# Altium footprint library Connectors.PcbLib: 70 footprints (part 4 of 5)
Each footprint in its own frame and in the unit in brackets; x right, y up, seen from the top. Pads: shape width x height; smd on the part's side, far side on the other; paste and mask are expansions set on the pad; w line width, h text height; cw(c..) or ccw(c..) is an arc to the next point about the centre after c.
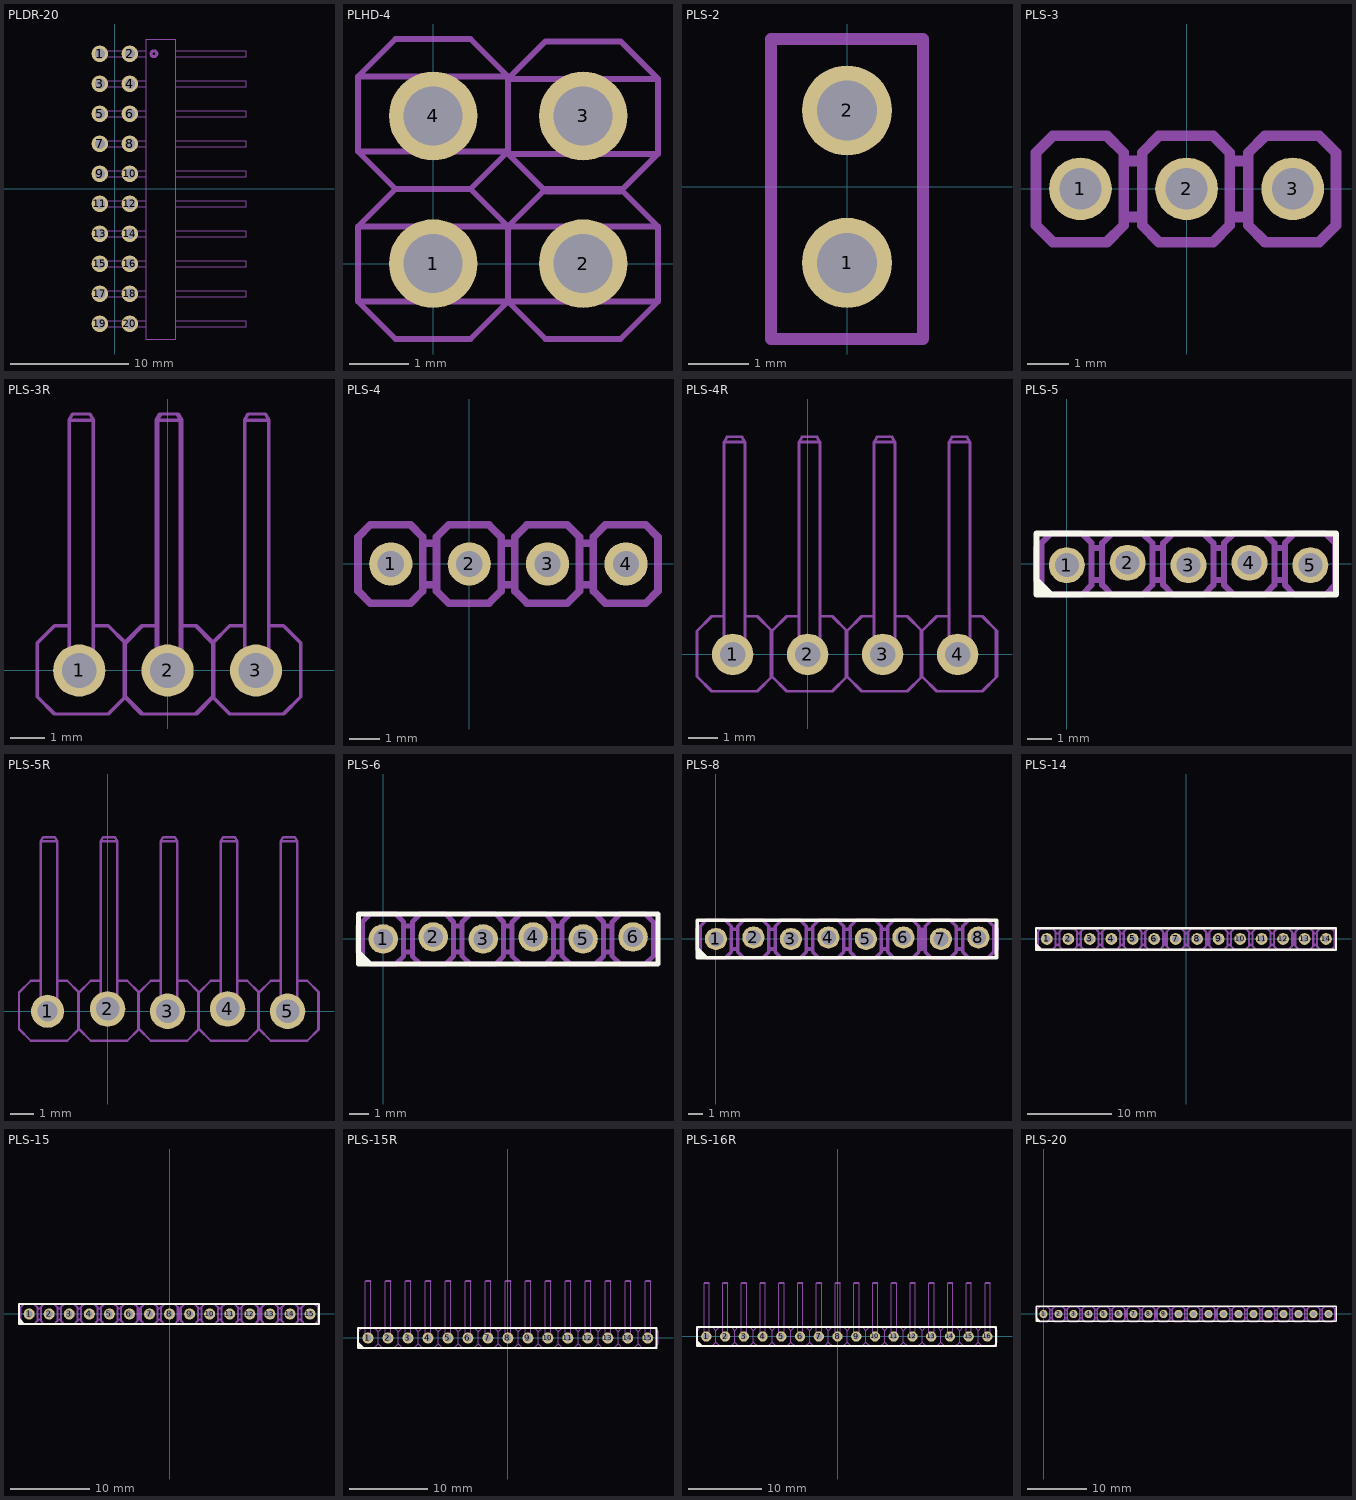
[diagram p3: the footprints below, top view; thin cyan lines are the x and y axes]

## PLDR-20 [mm]
pads (20):
  round 1.4 hole 0.85: 1(-1.27,11.43) 2(1.27,11.43) 3(-1.27,8.89) 4(1.27,8.89) 5(-1.27,6.35) 6(1.27,6.35) 7(-1.27,3.81) 8(1.27,3.81) 9(-1.27,1.27) 10(1.27,1.27) 11(-1.27,-1.27) 12(1.27,-1.27) 13(-1.27,-3.81) 14(1.27,-3.81) 15(-1.27,-6.35) 16(1.27,-6.35) 17(-1.27,-8.89) 18(1.27,-8.89) 19(-1.27,-11.43) 20(1.27,-11.43)
Top Assembly:
  drawing of 151 lines, arcs and shapes, not listed
3D body "User Library-PLDR-6.step": height 5.75, standoff -2.25, extent -1.456,5.057 11.084,12.677
3D body "User Library-PLDR-6.step": height 5.75, standoff -2.25, extent -1.456,2.517 11.084,10.137
3D body "User Library-PLDR-6.step": height 5.75, standoff -2.25, extent -1.456,-5.103 11.084,2.517
3D body "User Library-PLDR-6.step": height 5.75, standoff -2.25, extent -1.456,-12.723 11.084,-5.103

## PLHD-4 [mm]
pads (4):
  round 1.5 hole 1: 1(0,0) 2(2.54,0) 3(2.54,2.5) 4(0,2.5)
Top Assembly:
  lines w0.1: -1.273,-0.642 1.267,-0.642 ; -1.273,-0.642 -0.638,-1.277 0.632,-1.277 1.267,-0.642 ; -1.273,-0.642 -1.273,0.628 ; -1.273,0.628 1.267,0.628 ; -1.273,0.628 -0.638,1.263 ; -1.273,1.898 1.267,1.898 ; -1.273,1.898 -0.638,1.263 ; -1.273,1.898 -1.273,3.168 ; -1.273,3.168 1.267,3.168 ; -1.273,3.168 -0.638,3.803 0.632,3.803 1.267,3.168 ; -0.638,1.263 0.632,1.263 ; -0.638,1.263 0.632,1.263 ; -0.273,-0.277 -0.223,-0.227 ; -0.273,-0.277 -0.323,-0.227 -0.323,0.213 -0.273,0.263 ; -0.273,-0.277 -0.223,-0.327 0.217,-0.327 0.267,-0.277 ; -0.273,0.263 -0.223,0.213 ; -0.273,0.263 -0.223,0.313 0.217,0.313 0.267,0.263 ; -0.273,2.263 -0.223,2.313 ; -0.273,2.263 -0.323,2.313 -0.323,2.753 -0.273,2.803 ; -0.273,2.263 -0.223,2.213 0.217,2.213 0.267,2.263 ; -0.273,2.803 -0.223,2.753 ; -0.273,2.803 -0.223,2.853 0.217,2.853 0.267,2.803 ; -0.223,-0.227 -0.223,0.213 ; -0.223,-0.227 0.217,-0.227 ; -0.223,0.213 0.217,0.213 ; -0.223,2.313 -0.223,2.753 ; -0.223,2.313 0.217,2.313 ; -0.223,2.753 0.217,2.753 ; 0.217,-0.227 0.217,0.213 ; 0.217,-0.227 0.267,-0.277 ; 0.217,0.213 0.267,0.263 ; 0.217,2.313 0.217,2.753 ; 0.217,2.313 0.267,2.263 ; 0.217,2.753 0.267,2.803 ; 0.267,-0.277 0.317,-0.227 0.317,0.213 0.267,0.263 ; 0.267,2.263 0.317,2.313 0.317,2.753 0.267,2.803 ; 0.632,1.263 1.267,1.898 ; 0.632,1.263 1.267,0.628 ; 1.267,-0.642 3.807,-0.642 ; 1.267,-0.642 1.902,-1.277 3.172,-1.277 3.807,-0.642 ; 1.267,-0.642 1.267,0.628 ; 1.267,-0.642 1.267,0.628 ; 1.267,0.628 3.807,0.628 ; 1.267,0.628 1.902,1.263 3.172,1.263 3.807,0.628 ; 1.267,1.858 3.807,1.858 ; 1.267,1.858 1.902,1.223 3.172,1.223 3.807,1.858 ; 1.267,1.858 1.267,3.128 ; 1.267,1.898 1.267,3.168 ; 1.267,3.128 3.807,3.128 ; 1.267,3.128 1.902,3.763 3.172,3.763 3.807,3.128 ; 2.267,-0.277 2.317,-0.227 ; 2.267,-0.277 2.217,-0.227 2.217,0.213 2.267,0.263 ; 2.267,-0.277 2.317,-0.327 2.757,-0.327 2.807,-0.277 ; 2.267,0.263 2.317,0.213 ; 2.267,0.263 2.317,0.313 2.757,0.313 2.807,0.263 ; 2.267,2.223 2.317,2.273 ; 2.267,2.223 2.217,2.273 2.217,2.713 2.267,2.763 ; 2.267,2.223 2.317,2.173 2.757,2.173 2.807,2.223 ; 2.267,2.763 2.317,2.713 ; 2.267,2.763 2.317,2.813 2.757,2.813 2.807,2.763 ; 2.317,-0.227 2.317,0.213 ; 2.317,-0.227 2.757,-0.227 ; 2.317,0.213 2.757,0.213 ; 2.317,2.273 2.317,2.713 ; 2.317,2.273 2.757,2.273 ; 2.317,2.713 2.757,2.713 ; 2.757,-0.227 2.757,0.213 ; 2.757,-0.227 2.807,-0.277 ; 2.757,0.213 2.807,0.263 ; 2.757,2.273 2.757,2.713 ; 2.757,2.273 2.807,2.223 ; 2.757,2.713 2.807,2.763 ; 2.807,-0.277 2.857,-0.227 2.857,0.213 2.807,0.263 ; 2.807,2.223 2.857,2.273 2.857,2.713 2.807,2.763 ; 3.807,-0.642 3.807,0.628 ; 3.807,1.858 3.807,3.128
3D body "User Library-PLH-1.step": height 15.9, standoff -3, extent -1.273,-1.277 1.267,1.263
3D body "User Library-PLH-1.step": height 15.9, standoff -3, extent 1.267,-1.277 3.807,1.263
3D body "User Library-PLH-1.step": height 15.9, standoff -3, extent 1.267,1.223 3.807,3.763
3D body "User Library-PLH-1.step": height 15.9, standoff -3, extent -1.273,1.223 1.267,3.763

## PLS-2 [mm]
pads (2):
  round 1.5 hole 1: 1(0,-1.27) 2(0,1.27)
Top Assembly:
  lines w0.2: -1.27,-2.54 1.27,-2.54 1.27,2.46 -1.27,2.46 -1.27,-2.54
3D body "User Library-PLD-2.step": height 8.5, standoff -3, extent -1.27,-2.54 1.27,2.46

## PLS-3 [mm]
pads (3):
  round 1.5 hole 1: 1(-2.54,0) 2(0,0) 3(2.54,0)
Top Assembly:
  lines w0.254: -1.504,-0.674 -1.064,-0.674 ; -1.504,0.666 -1.064,0.666 ; 1.036,-0.674 1.476,-0.674 ; 1.036,0.666 1.476,0.666 ; -2.874,-0.324 -2.234,-0.324 ; -2.874,-0.324 -2.874,0.316 ; -2.874,-0.324 -2.674,-0.124 ; -2.874,0.316 -2.234,0.316 ; -2.874,0.316 -2.674,0.116 ; -2.674,-0.124 -2.434,-0.124 ; -2.674,-0.124 -2.674,0.116 ; -2.674,0.116 -2.434,0.116 ; -2.434,-0.124 -2.234,-0.324 ; -2.434,-0.124 -2.434,0.116 ; -2.434,0.116 -2.234,0.316 ; -2.234,-0.324 -2.234,0.316 ; -0.334,-0.324 -0.334,0.316 ; -0.334,-0.324 -0.134,-0.124 ; -0.334,-0.324 0.306,-0.324 ; -0.334,0.316 -0.134,0.116 ; -0.334,0.316 0.306,0.316 ; -0.134,-0.124 0.106,-0.124 ; -0.134,-0.124 -0.134,0.116 ; -0.134,0.116 0.106,0.116 ; 0.106,-0.124 0.306,-0.324 ; 0.106,-0.124 0.106,0.116 ; 0.106,0.116 0.306,0.316 ; 0.306,-0.324 0.306,0.316 ; 2.206,-0.324 2.846,-0.324 ; 2.206,-0.324 2.206,0.316 ; 2.206,-0.324 2.406,-0.124 ; 2.206,0.316 2.406,0.116 ; 2.206,0.316 2.846,0.316 ; 2.406,-0.124 2.646,-0.124 ; 2.406,-0.124 2.406,0.116 ; 2.406,0.116 2.646,0.116 ; 2.646,-0.124 2.846,-0.324 ; 2.646,-0.124 2.646,0.116 ; 2.646,0.116 2.846,0.316 ; 2.846,-0.324 2.846,0.316 ; -3.604,-0.874 -3.604,0.866 -3.204,1.266 -1.904,1.266 -1.504,0.866 -1.504,-0.874 -1.904,-1.274 -3.204,-1.274 -3.604,-0.874 ; -1.064,-0.874 -1.064,0.866 -0.664,1.266 0.636,1.266 1.036,0.866 1.036,-0.874 0.636,-1.274 -0.664,-1.274 -1.064,-0.874 ; 1.476,-0.874 1.476,0.866 1.876,1.266 3.176,1.266 3.576,0.866 3.576,-0.874 3.176,-1.274 1.876,-1.274 1.476,-0.874
3D body "User Library-PLD-2.step": height 8.5, standoff -3, extent -1.19,-1.27 3.81,1.27
3D body "User Library-PLD-2.step": height 8.5, standoff -3, extent -3.73,-1.27 1.27,1.27

## PLS-3R [mm]
pads (3):
  round 1.5 hole 1: 1(-2.54,0) 2(0,0) 3(2.54,0)
Top Assembly:
  lines w0.1: -2.83,1.29 -3.25,1.29 -3.75,0.79 -3.75,-0.75 -3.25,-1.25 -1.71,-1.25 -1.21,-0.75 ; -2.13,1.29 -1.71,1.29 -1.21,0.79 ; -0.33,1.29 -0.75,1.29 -1.25,0.79 -1.25,-0.75 -0.75,-1.25 0.79,-1.25 1.29,-0.75 ; -0.29,1.29 -0.71,1.29 -1.21,0.79 ; 0.37,1.29 0.79,1.29 1.29,0.79 ; 0.41,1.29 0.83,1.29 1.33,0.79 ; 2.21,1.29 1.79,1.29 1.29,0.79 ; 2.91,1.29 3.33,1.29 3.83,0.79 ; -2.83,0.37 -2.13,0.37 ; -2.83,0.37 -2.83,-0.33 -2.13,-0.33 -2.13,0.37 ; -2.83,0.37 -2.83,7.197 ; -2.83,7.197 -2.73,7.37 -2.23,7.37 -2.13,7.197 ; -2.83,7.197 -2.13,7.197 ; -2.13,0.37 -2.13,7.197 ; -1.21,-0.75 -0.71,-1.25 0.83,-1.25 1.33,-0.75 ; -1.21,-0.75 -1.21,0.79 ; -0.33,0.37 0.37,0.37 ; -0.33,0.37 -0.33,-0.33 0.37,-0.33 0.37,0.37 ; -0.33,0.37 -0.33,7.197 ; -0.33,7.197 -0.23,7.37 0.27,7.37 0.37,7.197 ; -0.33,7.197 0.37,7.197 ; -0.29,0.37 0.41,0.37 ; -0.29,0.37 -0.29,-0.33 0.41,-0.33 0.41,0.37 ; -0.29,0.37 -0.29,7.197 ; -0.29,7.197 -0.19,7.37 0.31,7.37 0.41,7.197 ; -0.29,7.197 0.41,7.197 ; 0.37,0.37 0.37,7.197 ; 0.41,0.37 0.41,7.197 ; 1.29,-0.75 1.79,-1.25 3.33,-1.25 3.83,-0.75 ; 1.29,-0.75 1.29,0.79 ; 1.33,-0.75 1.33,0.79 ; 1.33,-0.75 1.33,0.79 ; 2.21,0.37 2.91,0.37 ; 2.21,0.37 2.21,-0.33 2.91,-0.33 2.91,0.37 ; 2.21,0.37 2.21,7.197 ; 2.21,7.197 2.31,7.37 2.81,7.37 2.91,7.197 ; 2.21,7.197 2.91,7.197 ; 2.91,0.37 2.91,7.197 ; 3.83,-0.75 3.83,0.79 ; 3.83,-0.75 3.83,0.79
3D body "User Library-PLS-1R_D1.STEP": height 2.5, standoff -3, extent -3.81,-0.32 -1.27,10.04
3D body "User Library-PLS-1R_D1.STEP": height 2.5, standoff -3, extent -1.27,-0.32 1.27,10.04
3D body "User Library-PLS-1R_D1.STEP": height 2.5, standoff -3, extent 1.27,-0.32 3.81,10.04

## PLS-4 [mm]
pads (4):
  round 1.4 hole 0.85: 1(-2.54,0) 2(0,0) 3(2.54,0) 4(5.08,0)
Top Assembly:
  lines w0.254: -1.504,-0.674 -1.064,-0.674 ; -1.504,0.666 -1.064,0.666 ; 1.036,-0.674 1.476,-0.674 ; 1.036,0.666 1.476,0.666 ; 3.576,-0.674 4.016,-0.674 ; 3.576,0.666 4.016,0.666 ; -2.874,-0.324 -2.234,-0.324 ; -2.874,-0.324 -2.874,0.316 ; -2.874,-0.324 -2.674,-0.124 ; -2.874,0.316 -2.234,0.316 ; -2.874,0.316 -2.674,0.116 ; -2.674,-0.124 -2.434,-0.124 ; -2.674,-0.124 -2.674,0.116 ; -2.674,0.116 -2.434,0.116 ; -2.434,-0.124 -2.234,-0.324 ; -2.434,-0.124 -2.434,0.116 ; -2.434,0.116 -2.234,0.316 ; -2.234,-0.324 -2.234,0.316 ; -0.334,-0.324 -0.334,0.316 ; -0.334,-0.324 -0.134,-0.124 ; -0.334,-0.324 0.306,-0.324 ; -0.334,0.316 -0.134,0.116 ; -0.334,0.316 0.306,0.316 ; -0.134,-0.124 0.106,-0.124 ; -0.134,-0.124 -0.134,0.116 ; -0.134,0.116 0.106,0.116 ; 0.106,-0.124 0.306,-0.324 ; 0.106,-0.124 0.106,0.116 ; 0.106,0.116 0.306,0.316 ; 0.306,-0.324 0.306,0.316 ; 2.206,-0.324 2.846,-0.324 ; 2.206,-0.324 2.206,0.316 ; 2.206,-0.324 2.406,-0.124 ; 2.206,0.316 2.406,0.116 ; 2.206,0.316 2.846,0.316 ; 2.406,-0.124 2.646,-0.124 ; 2.406,-0.124 2.406,0.116 ; 2.406,0.116 2.646,0.116 ; 2.646,-0.124 2.846,-0.324 ; 2.646,-0.124 2.646,0.116 ; 2.646,0.116 2.846,0.316 ; 2.846,-0.324 2.846,0.316 ; 3.576,-0.874 3.576,0.866 ; 3.576,-0.874 3.576,0.866 ; 3.576,-0.874 3.176,-1.274 1.876,-1.274 1.476,-0.874 1.476,0.866 1.876,1.266 3.176,1.266 3.576,0.866 ; 4.746,-0.324 4.946,-0.124 ; 4.746,-0.324 4.746,0.316 ; 4.746,-0.324 5.386,-0.324 ; 4.746,0.316 5.386,0.316 ; 4.746,0.316 4.946,0.116 ; 4.946,-0.124 4.946,0.116 ; 4.946,-0.124 5.186,-0.124 ; 4.946,0.116 5.186,0.116 ; 5.186,-0.124 5.186,0.116 ; 5.186,-0.124 5.386,-0.324 ; 5.186,0.116 5.386,0.316 ; 5.386,-0.324 5.386,0.316 ; -3.604,-0.874 -3.604,0.866 -3.204,1.266 -1.904,1.266 -1.504,0.866 -1.504,-0.874 -1.904,-1.274 -3.204,-1.274 -3.604,-0.874 ; -1.064,-0.874 -1.064,0.866 -0.664,1.266 0.636,1.266 1.036,0.866 1.036,-0.874 0.636,-1.274 -0.664,-1.274 -1.064,-0.874 ; 4.016,-0.874 4.416,-1.274 5.716,-1.274 6.116,-0.874 6.116,0.866 5.716,1.266 4.416,1.266 4.016,0.866 4.016,-0.874
3D body "User Library-PLD-2.step": height 8.5, standoff -3, extent 1.35,-1.27 6.35,1.27
3D body "User Library-PLD-2.step": height 8.5, standoff -3, extent -3.73,-1.27 1.27,1.27

## PLS-4R [mm]
pads (4):
  round 1.4 hole 0.85: 1(-2.54,0) 2(0,0) 3(2.54,0) 4(5.08,0)
Top Assembly:
  lines w0.1: -2.83,1.29 -3.25,1.29 -3.75,0.79 -3.75,-0.75 -3.25,-1.25 -1.71,-1.25 -1.21,-0.75 ; -2.13,1.29 -1.71,1.29 -1.21,0.79 ; -1.25,-0.75 -1.25,0.79 ; -0.29,1.29 -0.71,1.29 -1.21,0.79 ; 0.41,1.29 0.83,1.29 1.33,0.79 ; 1.29,-0.75 1.29,0.79 ; 2.25,1.29 1.83,1.29 1.33,0.79 ; 2.95,1.29 3.37,1.29 3.87,0.79 ; 3.83,-0.75 3.83,0.79 ; 4.79,1.29 4.37,1.29 3.87,0.79 ; 5.49,1.29 5.91,1.29 6.41,0.79 6.41,-0.75 5.91,-1.25 4.37,-1.25 3.87,-0.75 ; 6.37,-0.75 6.37,0.79 ; -2.83,0.37 -2.13,0.37 ; -2.83,0.37 -2.83,-0.33 -2.13,-0.33 -2.13,0.37 ; -2.83,0.37 -2.83,7.197 ; -2.83,7.197 -2.73,7.37 -2.23,7.37 -2.13,7.197 ; -2.83,7.197 -2.13,7.197 ; -2.13,0.37 -2.13,7.197 ; -1.21,-0.75 -1.21,0.79 ; -1.21,-0.75 -0.71,-1.25 0.83,-1.25 1.33,-0.75 ; -1.21,-0.75 -1.21,0.79 ; -0.29,0.37 0.41,0.37 ; -0.29,0.37 -0.29,-0.33 0.41,-0.33 0.41,0.37 ; -0.29,0.37 -0.29,7.197 ; -0.29,7.197 -0.19,7.37 0.31,7.37 0.41,7.197 ; -0.29,7.197 0.41,7.197 ; 0.41,0.37 0.41,7.197 ; 1.33,-0.75 1.33,0.79 ; 1.33,-0.75 1.83,-1.25 3.37,-1.25 3.87,-0.75 ; 1.33,-0.75 1.33,0.79 ; 2.25,0.37 2.95,0.37 ; 2.25,0.37 2.25,-0.33 2.95,-0.33 2.95,0.37 ; 2.25,0.37 2.25,7.197 ; 2.25,7.197 2.35,7.37 2.85,7.37 2.95,7.197 ; 2.25,7.197 2.95,7.197 ; 2.95,0.37 2.95,7.197 ; 3.87,-0.75 3.87,0.79 ; 3.87,-0.75 3.87,0.79 ; 4.79,0.37 5.49,0.37 ; 4.79,0.37 4.79,-0.33 5.49,-0.33 5.49,0.37 ; 4.79,0.37 4.79,7.197 ; 4.79,7.197 4.89,7.37 5.39,7.37 5.49,7.197 ; 4.79,7.197 5.49,7.197 ; 5.49,0.37 5.49,7.197
3D body "User Library-PLS-1R_D1.STEP": height 2.5, standoff -3, extent -3.81,-0.32 -1.27,10.04
3D body "User Library-PLS-1R_D1.STEP": height 2.5, standoff -3, extent -1.27,-0.32 1.27,10.04
3D body "User Library-PLS-1R_D1.STEP": height 2.5, standoff -3, extent 1.27,-0.32 3.81,10.04
3D body "User Library-PLS-1R_D1.STEP": height 2.5, standoff -3, extent 3.81,-0.32 6.35,10.04

## PLS-5 [mm]
pads (5):
  round 1.5 hole 1: 1(0,-0.051) 2(2.54,0.051) 3(5.08,-0.051) 4(7.62,0.051) 5(10.16,-0.051)
Top Overlay:
  region: -1.27,-0.5 -0.5,-1.27 -1.27,-1.27
  lines w0.254: -1.27,-1.27 -1.27,1.27 11.23,1.27 11.23,-1.27 -1.27,-1.27
Top Assembly:
  lines w0.254: -1.064,-0.674 -1.284,-0.674 -1.284,0.666 -1.064,0.666 ; 1.036,-0.674 1.476,-0.674 ; 1.036,0.666 1.476,0.666 ; 3.576,-0.674 4.016,-0.674 ; 3.576,0.666 4.016,0.666 ; 6.116,-0.674 6.556,-0.674 ; 6.116,0.666 6.556,0.666 ; 8.656,-0.674 9.096,-0.674 ; 8.656,0.666 9.096,0.666 ; -0.334,-0.324 0.306,-0.324 ; -0.334,-0.324 -0.334,0.316 ; -0.334,-0.324 -0.134,-0.124 ; -0.334,0.316 0.306,0.316 ; -0.334,0.316 -0.134,0.116 ; -0.134,-0.124 0.106,-0.124 ; -0.134,-0.124 -0.134,0.116 ; -0.134,0.116 0.106,0.116 ; 0.106,-0.124 0.306,-0.324 ; 0.106,-0.124 0.106,0.116 ; 0.106,0.116 0.306,0.316 ; 0.306,-0.324 0.306,0.316 ; 2.206,-0.324 2.206,0.316 ; 2.206,-0.324 2.406,-0.124 ; 2.206,-0.324 2.846,-0.324 ; 2.206,0.316 2.406,0.116 ; 2.206,0.316 2.846,0.316 ; 2.406,-0.124 2.646,-0.124 ; 2.406,-0.124 2.406,0.116 ; 2.406,0.116 2.646,0.116 ; 2.646,-0.124 2.846,-0.324 ; 2.646,-0.124 2.646,0.116 ; 2.646,0.116 2.846,0.316 ; 2.846,-0.324 2.846,0.316 ; 4.746,-0.324 5.386,-0.324 ; 4.746,-0.324 4.746,0.316 ; 4.746,-0.324 4.946,-0.124 ; 4.746,0.316 4.946,0.116 ; 4.746,0.316 5.386,0.316 ; 4.946,-0.124 5.186,-0.124 ; 4.946,-0.124 4.946,0.116 ; 4.946,0.116 5.186,0.116 ; 5.186,-0.124 5.386,-0.324 ; 5.186,-0.124 5.186,0.116 ; 5.186,0.116 5.386,0.316 ; 5.386,-0.324 5.386,0.316 ; 7.286,-0.324 7.926,-0.324 ; 7.286,-0.324 7.286,0.316 ; 7.286,-0.324 7.486,-0.124 ; 7.286,0.316 7.926,0.316 ; 7.286,0.316 7.486,0.116 ; 7.486,-0.124 7.726,-0.124 ; 7.486,-0.124 7.486,0.116 ; 7.486,0.116 7.726,0.116 ; 7.726,-0.124 7.926,-0.324 ; 7.726,-0.124 7.726,0.116 ; 7.726,0.116 7.926,0.316 ; 7.926,-0.324 7.926,0.316 ; 9.826,-0.324 10.466,-0.324 ; 9.826,-0.324 9.826,0.316 ; 9.826,-0.324 10.026,-0.124 ; 9.826,0.316 10.466,0.316 ; 9.826,0.316 10.026,0.116 ; 10.026,-0.124 10.266,-0.124 ; 10.026,-0.124 10.026,0.116 ; 10.026,0.116 10.266,0.116 ; 10.266,-0.124 10.266,0.116 ; 10.266,-0.124 10.466,-0.324 ; 10.266,0.116 10.466,0.316 ; 10.466,-0.324 10.466,0.316 ; -1.064,-0.874 -1.064,0.866 -0.664,1.266 0.636,1.266 1.036,0.866 1.036,-0.874 0.636,-1.274 -0.664,-1.274 -1.064,-0.874 ; 1.476,-0.874 1.476,0.866 1.876,1.266 3.176,1.266 3.576,0.866 3.576,-0.874 3.176,-1.274 1.876,-1.274 1.476,-0.874 ; 4.016,-0.874 4.016,0.866 4.416,1.266 5.716,1.266 6.116,0.866 6.116,-0.874 5.716,-1.274 4.416,-1.274 4.016,-0.874 ; 6.556,-0.874 6.556,0.866 6.956,1.266 8.256,1.266 8.656,0.866 8.656,-0.874 8.256,-1.274 6.956,-1.274 6.556,-0.874 ; 9.096,-0.874 9.096,0.866 9.496,1.266 10.796,1.266 11.196,0.866 11.196,-0.874 10.796,-1.274 9.496,-1.274 9.096,-0.874

## PLS-5R [mm]
pads (5):
  round 1.4 hole 0.85: 1(-2.54,0)
  round 1.5 hole 1: 2(0,0.102) 3(2.54,0) 4(5.08,0.102) 5(7.62,0)
Top Assembly:
  lines w0.1: -2.83,1.29 -3.25,1.29 -3.75,0.79 -3.75,-0.75 -3.25,-1.25 -1.71,-1.25 -1.21,-0.75 ; -2.13,1.29 -1.71,1.29 -1.21,0.79 ; -1.25,-0.75 -1.25,0.79 ; -0.29,1.29 -0.71,1.29 -1.21,0.79 ; 0.41,1.29 0.83,1.29 1.33,0.79 ; 1.29,-0.75 1.29,0.79 ; 2.25,1.29 1.83,1.29 1.33,0.79 ; 2.95,1.29 3.37,1.29 3.87,0.79 ; 3.83,-0.75 3.83,0.79 ; 4.79,1.29 4.37,1.29 3.87,0.79 ; 5.49,1.29 5.91,1.29 6.41,0.79 ; 7.33,1.29 6.91,1.29 6.41,0.79 ; 8.03,1.29 8.45,1.29 8.95,0.79 8.95,-0.75 8.45,-1.25 6.91,-1.25 6.41,-0.75 ; 8.91,-0.75 8.91,0.79 ; -2.83,0.37 -2.13,0.37 ; -2.83,0.37 -2.83,-0.33 -2.13,-0.33 -2.13,0.37 ; -2.83,0.37 -2.83,7.197 ; -2.83,7.197 -2.73,7.37 -2.23,7.37 -2.13,7.197 ; -2.83,7.197 -2.13,7.197 ; -2.13,0.37 -2.13,7.197 ; -1.21,-0.75 -1.21,0.79 ; -1.21,-0.75 -0.71,-1.25 0.83,-1.25 1.33,-0.75 ; -1.21,-0.75 -1.21,0.79 ; -0.29,0.37 0.41,0.37 ; -0.29,0.37 -0.29,-0.33 0.41,-0.33 0.41,0.37 ; -0.29,0.37 -0.29,7.197 ; -0.29,7.197 -0.19,7.37 0.31,7.37 0.41,7.197 ; -0.29,7.197 0.41,7.197 ; 0.41,0.37 0.41,7.197 ; 1.33,-0.75 1.33,0.79 ; 1.33,-0.75 1.83,-1.25 3.37,-1.25 3.87,-0.75 ; 1.33,-0.75 1.33,0.79 ; 2.25,0.37 2.95,0.37 ; 2.25,0.37 2.25,-0.33 2.95,-0.33 2.95,0.37 ; 2.25,0.37 2.25,7.197 ; 2.25,7.197 2.35,7.37 2.85,7.37 2.95,7.197 ; 2.25,7.197 2.95,7.197 ; 2.95,0.37 2.95,7.197 ; 3.87,-0.75 3.87,0.79 ; 3.87,-0.75 4.37,-1.25 5.91,-1.25 6.41,-0.75 ; 3.87,-0.75 3.87,0.79 ; 4.79,0.37 5.49,0.37 ; 4.79,0.37 4.79,-0.33 5.49,-0.33 5.49,0.37 ; 4.79,0.37 4.79,7.197 ; 4.79,7.197 4.89,7.37 5.39,7.37 5.49,7.197 ; 4.79,7.197 5.49,7.197 ; 5.49,0.37 5.49,7.197 ; 6.41,-0.75 6.41,0.79 ; 6.41,-0.75 6.41,0.79 ; 6.41,-0.75 6.41,0.79 ; 7.33,0.37 7.33,7.197 ; 7.33,0.37 7.33,-0.33 8.03,-0.33 8.03,0.37 ; 7.33,0.37 8.03,0.37 ; 7.33,7.197 8.03,7.197 ; 7.33,7.197 7.43,7.37 7.93,7.37 8.03,7.197 ; 8.03,0.37 8.03,7.197 ; 6.37,-0.75 6.37,0.79 6.37,-0.75
3D body "User Library-PLS-1R_D1.STEP": height 2.5, standoff -3, extent -3.81,-0.32 -1.27,10.04
3D body "User Library-PLS-1R_D1.STEP": height 2.5, standoff -3, extent -1.27,-0.32 1.27,10.04
3D body "User Library-PLS-1R_D1.STEP": height 2.5, standoff -3, extent 1.27,-0.32 3.81,10.04
3D body "User Library-PLS-1R_D1.STEP": height 2.5, standoff -3, extent 3.81,-0.32 6.35,10.04
3D body "User Library-PLS-1R_D1.STEP": height 2.5, standoff -3, extent 6.35,-0.32 8.89,10.04

## PLS-6 [mm]
pads (6):
  round 1.5 hole 1: 1(0,0) 2(2.54,0.102) 3(5.08,0) 4(7.62,0.102) 5(10.16,0) 6(12.7,0.102)
Top Overlay:
  region: -1.27,-0.5 -0.5,-1.27 -1.27,-1.27
  lines w0.254: -1.27,-1.27 13.97,-1.27 13.97,1.27 -1.27,1.27 -1.27,-1.27
Top Assembly:
  lines w0.254: -1.064,-0.674 -1.284,-0.674 -1.284,0.666 -1.064,0.666 ; 1.036,-0.674 1.476,-0.674 ; 1.036,0.666 1.476,0.666 ; 3.576,-0.674 4.016,-0.674 ; 3.576,0.666 4.016,0.666 ; 6.116,-0.674 6.556,-0.674 ; 6.116,0.666 6.556,0.666 ; 8.656,-0.674 9.096,-0.674 ; 8.656,0.666 9.096,0.666 ; 11.196,-0.674 11.636,-0.674 ; 11.196,0.666 11.636,0.666 ; 13.736,-0.674 13.956,-0.674 13.956,0.666 13.736,0.666 ; -0.334,-0.324 0.306,-0.324 ; -0.334,-0.324 -0.334,0.316 ; -0.334,-0.324 -0.134,-0.124 ; -0.334,0.316 0.306,0.316 ; -0.334,0.316 -0.134,0.116 ; -0.134,-0.124 0.106,-0.124 ; -0.134,-0.124 -0.134,0.116 ; -0.134,0.116 0.106,0.116 ; 0.106,-0.124 0.306,-0.324 ; 0.106,-0.124 0.106,0.116 ; 0.106,0.116 0.306,0.316 ; 0.306,-0.324 0.306,0.316 ; 2.206,-0.324 2.206,0.316 ; 2.206,-0.324 2.406,-0.124 ; 2.206,-0.324 2.846,-0.324 ; 2.206,0.316 2.406,0.116 ; 2.206,0.316 2.846,0.316 ; 2.406,-0.124 2.646,-0.124 ; 2.406,-0.124 2.406,0.116 ; 2.406,0.116 2.646,0.116 ; 2.646,-0.124 2.846,-0.324 ; 2.646,-0.124 2.646,0.116 ; 2.646,0.116 2.846,0.316 ; 2.846,-0.324 2.846,0.316 ; 4.746,-0.324 5.386,-0.324 ; 4.746,-0.324 4.746,0.316 ; 4.746,-0.324 4.946,-0.124 ; 4.746,0.316 4.946,0.116 ; 4.746,0.316 5.386,0.316 ; 4.946,-0.124 5.186,-0.124 ; 4.946,-0.124 4.946,0.116 ; 4.946,0.116 5.186,0.116 ; 5.186,-0.124 5.386,-0.324 ; 5.186,-0.124 5.186,0.116 ; 5.186,0.116 5.386,0.316 ; 5.386,-0.324 5.386,0.316 ; 7.286,-0.324 7.926,-0.324 ; 7.286,-0.324 7.286,0.316 ; 7.286,-0.324 7.486,-0.124 ; 7.286,0.316 7.926,0.316 ; 7.286,0.316 7.486,0.116 ; 7.486,-0.124 7.726,-0.124 ; 7.486,-0.124 7.486,0.116 ; 7.486,0.116 7.726,0.116 ; 7.726,-0.124 7.926,-0.324 ; 7.726,-0.124 7.726,0.116 ; 7.726,0.116 7.926,0.316 ; 7.926,-0.324 7.926,0.316 ; 9.826,-0.324 10.466,-0.324 ; 9.826,-0.324 9.826,0.316 ; 9.826,-0.324 10.026,-0.124 ; 9.826,0.316 10.466,0.316 ; 9.826,0.316 10.026,0.116 ; 10.026,-0.124 10.266,-0.124 ; 10.026,-0.124 10.026,0.116 ; 10.026,0.116 10.266,0.116 ; 10.266,-0.124 10.266,0.116 ; 10.266,-0.124 10.466,-0.324 ; 10.266,0.116 10.466,0.316 ; 10.466,-0.324 10.466,0.316 ; 12.366,-0.324 12.366,0.316 ; 12.366,-0.324 12.566,-0.124 ; 12.366,-0.324 13.006,-0.324 ; 12.366,0.316 12.566,0.116 ; 12.366,0.316 13.006,0.316 ; 12.566,-0.124 12.566,0.116 ; 12.566,-0.124 12.806,-0.124 ; 12.566,0.116 12.806,0.116 ; 12.806,-0.124 12.806,0.116 ; 12.806,-0.124 13.006,-0.324 ; 12.806,0.116 13.006,0.316 ; 13.006,-0.324 13.006,0.316 ; -1.064,-0.874 -1.064,0.866 -0.664,1.266 0.636,1.266 1.036,0.866 1.036,-0.874 0.636,-1.274 -0.664,-1.274 -1.064,-0.874 ; 1.476,-0.874 1.476,0.866 1.876,1.266 3.176,1.266 3.576,0.866 3.576,-0.874 3.176,-1.274 1.876,-1.274 1.476,-0.874 ; 4.016,-0.874 4.016,0.866 4.416,1.266 5.716,1.266 6.116,0.866 6.116,-0.874 5.716,-1.274 4.416,-1.274 4.016,-0.874 ; 6.556,-0.874 6.556,0.866 6.956,1.266 8.256,1.266 8.656,0.866 8.656,-0.874 8.256,-1.274 6.956,-1.274 6.556,-0.874 ; 9.096,-0.874 9.096,0.866 9.496,1.266 10.796,1.266 11.196,0.866 11.196,-0.874 10.796,-1.274 9.496,-1.274 9.096,-0.874 ; 11.636,-0.874 11.636,0.866 12.036,1.266 13.336,1.266 13.736,0.866 13.736,-0.874 13.336,-1.274 12.036,-1.274 11.636,-0.874
3D body "User Library-PLS-6-1.step": height 8.54, standoff -3, extent -1.27,-1.27 13.97,1.27

## PLS-8 [mm]
pads (8):
  round 1.5 hole 1: 1(0,0) 2(2.54,0.102) 3(5.08,0) 4(7.62,0.102) 5(10.16,0) 6(12.7,0.102) 7(15.24,0) 8(17.78,0.102)
Top Overlay:
  region: -1.27,-0.5 -0.5,-1.27 -1.27,-1.27
  lines w0.254: -1.27,-1.27 19,-1.27 19,1.27 -1.27,1.27 -1.27,-1.27
Top Assembly:
  drawing of 181 lines, arcs and shapes, not listed
3D body "User Library-PLD-2.step": height 8.5, standoff -3, extent -1.19,-1.27 3.81,1.27
3D body "User Library-PLD-2.step": height 8.5, standoff -3, extent 3.89,-1.27 8.89,1.27
3D body "User Library-PLD-2.step": height 8.5, standoff -3, extent 8.97,-1.27 13.97,1.27
3D body "User Library-PLD-2.step": height 8.5, standoff -3, extent 14.05,-1.27 19.05,1.27

## PLS-14 [mm]
pads (14):
  round 1.4 hole 0.85: 1(-16.51,0) 2(-13.97,0) 3(-11.43,0) 4(-8.89,0) 5(-6.35,0) 6(-3.81,0) 7(-1.27,0) 8(1.27,0) 9(3.81,0) 10(6.35,0) 11(8.89,0) 12(11.43,0) 13(13.97,0) 14(16.51,0)
Top Overlay:
  region: -17.78,-0.5 -17.01,-1.27 -17.78,-1.27
  lines w0.254: -17.78,-1.27 17.69,-1.27 17.69,1.27 -17.78,1.27 -17.78,-1.27
Top Assembly:
  drawing of 320 lines, arcs and shapes, not listed
3D body "User Library-PLD-2.step": height 8.5, standoff -3, extent 12.78,-1.27 17.78,1.27
3D body "User Library-PLD-2.step": height 8.5, standoff -3, extent 7.7,-1.27 12.7,1.27
3D body "User Library-PLD-2.step": height 8.5, standoff -3, extent 2.62,-1.27 7.62,1.27
3D body "User Library-PLD-2.step": height 8.5, standoff -3, extent -17.7,-1.27 -12.7,1.27
3D body "User Library-PLD-2.step": height 8.5, standoff -3, extent -12.62,-1.27 -7.62,1.27
3D body "User Library-PLD-2.step": height 8.5, standoff -3, extent -7.54,-1.27 -2.54,1.27
3D body "User Library-PLD-2.step": height 8.5, standoff -3, extent -2.46,-1.27 2.54,1.27

## PLS-15 [mm]
pads (15):
  round 1.4 hole 0.85: 1(-17.78,0) 2(-15.24,0) 3(-12.7,0) 4(-10.16,0) 5(-7.62,0) 6(-5.08,0) 7(-2.54,0) 8(0,0) 9(2.54,0) 10(5.08,0) 11(7.62,0) 12(10.16,0) 13(12.7,0) 14(15.24,0) 15(17.78,0)
Top Overlay:
  region: -19.05,-0.5 -18.28,-1.27 -19.05,-1.27
  lines w0.254: -19.05,-1.27 18.92,-1.27 18.92,1.27 -19.05,1.27 -19.05,-1.27
Top Assembly:
  drawing of 343 lines, arcs and shapes, not listed
3D body "User Library-PLD-2.step": height 8.5, standoff -3, extent 11.51,-1.27 16.51,1.27
3D body "User Library-PLD-2.step": height 8.5, standoff -3, extent 6.43,-1.27 11.43,1.27
3D body "User Library-PLD-2.step": height 8.5, standoff -3, extent 1.35,-1.27 6.35,1.27
3D body "User Library-PLD-2.step": height 8.5, standoff -3, extent -18.97,-1.27 -13.97,1.27
3D body "User Library-PLD-2.step": height 8.5, standoff -3, extent -13.89,-1.27 -8.89,1.27
3D body "User Library-PLD-2.step": height 8.5, standoff -3, extent -8.81,-1.27 -3.81,1.27
3D body "User Library-PLD-2.step": height 8.5, standoff -3, extent -3.73,-1.27 1.27,1.27
3D body "User Library-PLD-2.step": height 8.5, standoff -3, extent 14.05,-1.27 19.05,1.27

## PLS-15R [mm]
pads (15):
  round 1.4 hole 0.85: 1(-17.78,0) 2(-15.24,0) 3(-12.7,0) 4(-10.16,0) 5(-7.62,0) 6(-5.08,0) 7(-2.54,0) 8(0,0) 9(2.54,0) 10(5.08,0) 11(7.62,0) 12(10.16,0) 13(12.7,0) 14(15.24,0) 15(17.78,0)
Top Overlay:
  region: -19.05,-0.5 -18.28,-1.27 -19.05,-1.27
  lines w0.254: -19.05,-1.27 -19.05,1.27 18.92,1.27 18.92,-1.27 -19.05,-1.27
Top Assembly:
  drawing of 296 lines, arcs and shapes, not listed
3D body "User Library-PLS-1R_D1.STEP": height 2.5, standoff -3, extent 16.509,-0.32 19.049,10.04
3D body "User Library-PLS-1R_D1.STEP": height 2.5, standoff -3, extent 13.97,-0.32 16.51,10.04
3D body "User Library-PLS-1R_D1.STEP": height 2.5, standoff -3, extent 13.97,-0.32 16.51,10.04
3D body "User Library-PLS-1R_D1.STEP": height 2.5, standoff -3, extent 11.43,-0.32 13.97,10.04
3D body "User Library-PLS-1R_D1.STEP": height 2.5, standoff -3, extent 8.89,-0.32 11.43,10.04
3D body "User Library-PLS-1R_D1.STEP": height 2.5, standoff -3, extent 6.35,-0.32 8.89,10.04
3D body "User Library-PLS-1R_D1.STEP": height 2.5, standoff -3, extent 3.81,-0.32 6.35,10.04
3D body "User Library-PLS-1R_D1.STEP": height 2.5, standoff -3, extent 1.27,-0.32 3.81,10.04
3D body "User Library-PLS-1R_D1.STEP": height 2.5, standoff -3, extent -1.271,-0.32 1.269,10.04
3D body "User Library-PLS-1R_D1.STEP": height 2.5, standoff -3, extent -3.81,-0.32 -1.27,10.04
3D body "User Library-PLS-1R_D1.STEP": height 2.5, standoff -3, extent -6.35,-0.32 -3.81,10.04
3D body "User Library-PLS-1R_D1.STEP": height 2.5, standoff -3, extent -8.89,-0.32 -6.35,10.04
3D body "User Library-PLS-1R_D1.STEP": height 2.5, standoff -3, extent -11.43,-0.32 -8.89,10.04
3D body "User Library-PLS-1R_D1.STEP": height 2.5, standoff -3, extent -13.97,-0.32 -11.43,10.04
3D body "User Library-PLS-1R_D1.STEP": height 2.5, standoff -3, extent -16.51,-0.32 -13.97,10.04
3D body "User Library-PLS-1R_D1.STEP": height 2.5, standoff -3, extent -19.05,-0.32 -16.51,10.04

## PLS-16R [mm]
pads (16):
  round 1.4 hole 0.85: 1(-17.78,0) 2(-15.24,0) 3(-12.7,0) 4(-10.16,0) 5(-7.62,0) 6(-5.08,0) 7(-2.54,0) 8(0,0) 9(2.54,0) 10(5.08,0) 11(7.62,0) 12(10.16,0) 13(12.7,0) 14(15.24,0) 15(17.78,0) 16(20.32,0)
Top Overlay:
  region: -19.05,-0.5 -18.28,-1.27 -19.05,-1.27
  lines w0.254: 21.46,-1.27 21.46,1.27 ; -19.05,-1.27 -19.05,1.27 21.5,1.27 21.5,-1.27 -19.05,-1.27
Top Assembly:
  drawing of 320 lines, arcs and shapes, not listed
3D body "User Library-PLS-1R_D1.STEP": height 2.5, standoff -3, extent 19.049,-0.32 21.589,10.04
3D body "User Library-PLS-1R_D1.STEP": height 2.5, standoff -3, extent 16.509,-0.32 19.049,10.04
3D body "User Library-PLS-1R_D1.STEP": height 2.5, standoff -3, extent 13.97,-0.32 16.51,10.04
3D body "User Library-PLS-1R_D1.STEP": height 2.5, standoff -3, extent 13.97,-0.32 16.51,10.04
3D body "User Library-PLS-1R_D1.STEP": height 2.5, standoff -3, extent 11.43,-0.32 13.97,10.04
3D body "User Library-PLS-1R_D1.STEP": height 2.5, standoff -3, extent 8.89,-0.32 11.43,10.04
3D body "User Library-PLS-1R_D1.STEP": height 2.5, standoff -3, extent 6.35,-0.32 8.89,10.04
3D body "User Library-PLS-1R_D1.STEP": height 2.5, standoff -3, extent 3.81,-0.32 6.35,10.04
3D body "User Library-PLS-1R_D1.STEP": height 2.5, standoff -3, extent 1.27,-0.32 3.81,10.04
3D body "User Library-PLS-1R_D1.STEP": height 2.5, standoff -3, extent -1.271,-0.32 1.269,10.04
3D body "User Library-PLS-1R_D1.STEP": height 2.5, standoff -3, extent -3.81,-0.32 -1.27,10.04
3D body "User Library-PLS-1R_D1.STEP": height 2.5, standoff -3, extent -6.35,-0.32 -3.81,10.04
3D body "User Library-PLS-1R_D1.STEP": height 2.5, standoff -3, extent -8.89,-0.32 -6.35,10.04
3D body "User Library-PLS-1R_D1.STEP": height 2.5, standoff -3, extent -11.43,-0.32 -8.89,10.04
3D body "User Library-PLS-1R_D1.STEP": height 2.5, standoff -3, extent -13.97,-0.32 -11.43,10.04
3D body "User Library-PLS-1R_D1.STEP": height 2.5, standoff -3, extent -16.51,-0.32 -13.97,10.04
3D body "User Library-PLS-1R_D1.STEP": height 2.5, standoff -3, extent -19.05,-0.32 -16.51,10.04

## PLS-20 [mm]
pads (20):
  round 1.4 hole 0.85: 1(0,0) 2(2.54,0) 3(5.08,0) 4(7.62,0) 5(10.16,0) 6(12.7,0) 7(15.24,0) 8(17.78,0) 9(20.32,0) 10(22.86,0) 11(25.4,0) 12(27.94,0) 13(30.48,0) 14(33.02,0) 15(35.56,0) 16(38.1,0) 17(40.64,0) 18(43.18,0) 19(45.72,0) 20(48.26,0)
Top Overlay:
  region: -1.27,-0.5 -0.5,-1.27 -1.27,-1.27
  lines w0.254: -1.27,-1.27 49.53,-1.27 49.53,1.27 -1.27,1.27 -1.27,-1.27
Top Assembly:
  drawing of 453 lines, arcs and shapes, not listed
3D body "User Library-PLD-2.step": height 8.5, standoff -3, extent 44.53,-1.27 49.53,1.27
3D body "User Library-PLD-2.step": height 8.5, standoff -3, extent 41.99,-1.27 46.99,1.27
3D body "User Library-PLD-2.step": height 8.5, standoff -3, extent 36.91,-1.27 41.91,1.27
3D body "User Library-PLD-2.step": height 8.5, standoff -3, extent 29.29,-1.27 34.29,1.27
3D body "User Library-PLD-2.step": height 8.5, standoff -3, extent 24.21,-1.27 29.21,1.27
3D body "User Library-PLD-2.step": height 8.5, standoff -3, extent 19.13,-1.27 24.13,1.27
3D body "User Library-PLD-2.step": height 8.5, standoff -3, extent -1.19,-1.27 3.81,1.27
3D body "User Library-PLD-2.step": height 8.5, standoff -3, extent 3.89,-1.27 8.89,1.27
3D body "User Library-PLD-2.step": height 8.5, standoff -3, extent 8.97,-1.27 13.97,1.27
3D body "User Library-PLD-2.step": height 8.5, standoff -3, extent 14.05,-1.27 19.05,1.27
3D body "User Library-PLD-2.step": height 8.5, standoff -3, extent 31.83,-1.27 36.83,1.27